# Altium footprint library 针式电感.PcbLib: 75 footprints (part 5 of 5)
Each footprint in its own frame and in the unit in brackets; x right, y up, seen from the top. Pads: shape width x height; smd on the part's side, far side on the other; paste and mask are expansions set on the pad; w line width, h text height; cw(c..) or ccw(c..) is an arc to the next point about the centre after c.
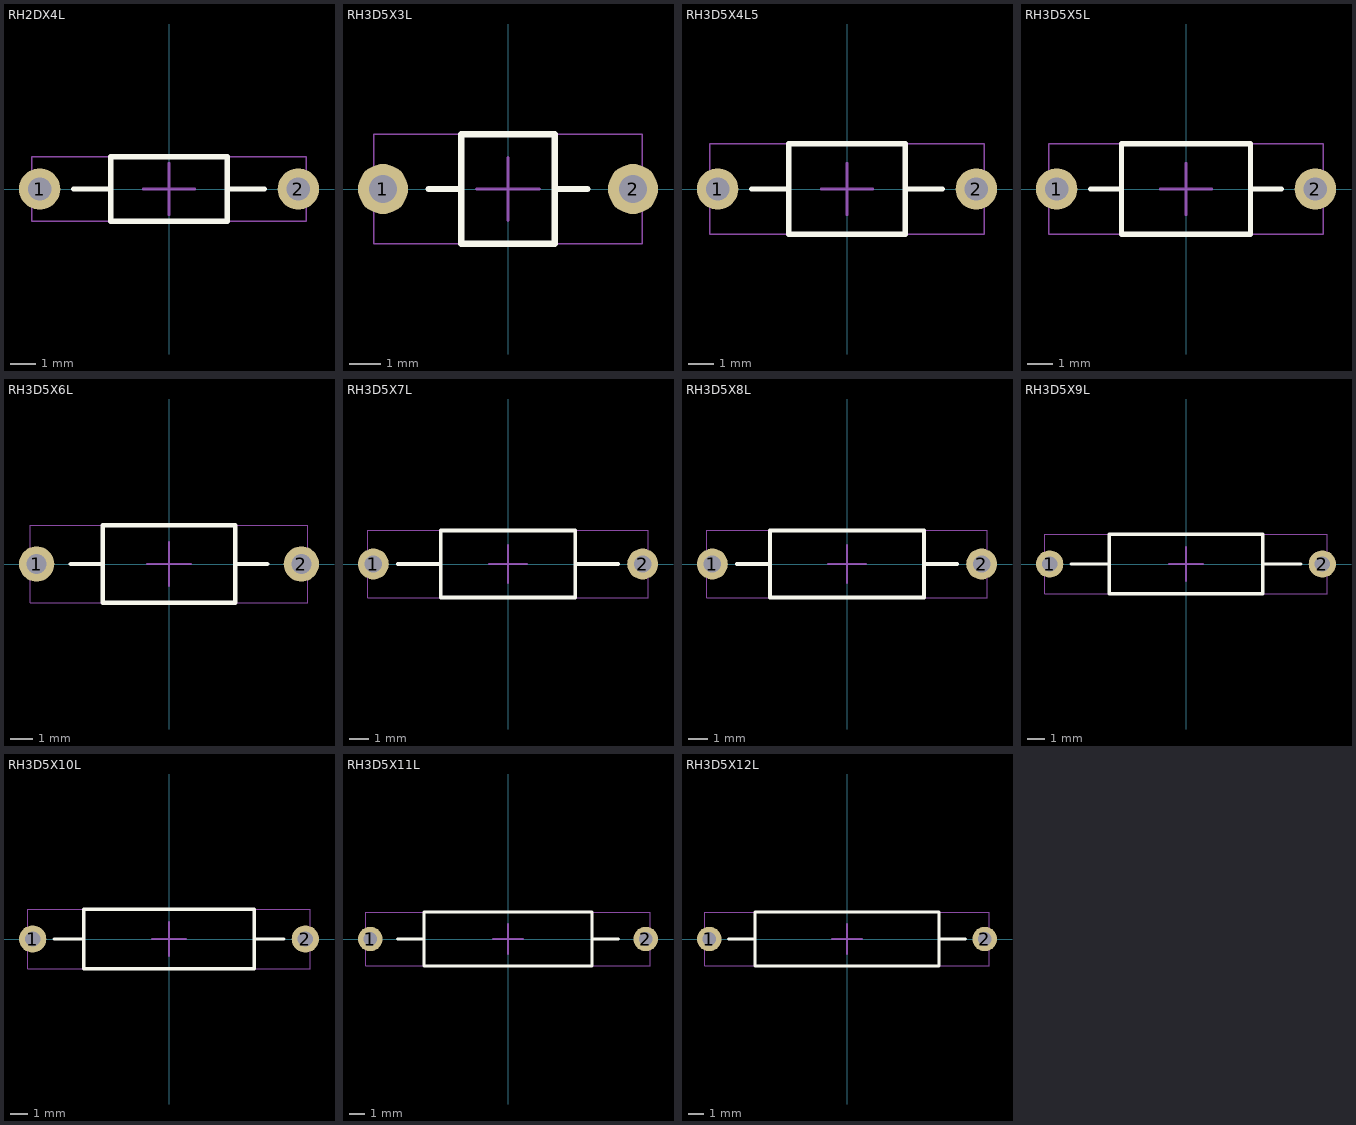
[diagram p4: the footprints below, top view; thin cyan lines are the x and y axes]

## RH2DX4L [mm] "穿心磁珠"
height 2
pads (2):
  round 1.6 hole 0.9: 1(-5,0) 2(5,0)
Top Overlay:
  lines w0.2: -3.683,0 -2.25,0 ; 2.25,0 3.683,0 ; -2.25,-1.25 -2.25,1.25 2.25,1.25 2.25,-1.25 -2.25,-1.25
Mechanical 13:
  lines w0.05: -5.3,-1.25 -5.3,1.25 5.3,1.25 5.3,-1.25 -5.3,-1.25
Mechanical 15:
  lines w0.1: -1,0 1,0 ; 0,-1 0,1
3D body: height 2.75, standoff -3.25, extent -5.3,-1.25 5.3,1.25

## RH3D5X3L [mm] "穿心磁珠"
height 3
pads (2):
  round 1.6 hole 0.9: 1(-4,0) 2(4,0)
Top Overlay:
  lines w0.2: -2.54,0 -1.5,0 ; 1.5,0 2.54,0 ; -1.5,-1.75 -1.5,1.75 1.5,1.75 1.5,-1.75 -1.5,-1.75
Mechanical 13:
  lines w0.05: -4.3,-1.75 -4.3,1.75 4.3,1.75 4.3,-1.75 -4.3,-1.75
Mechanical 15:
  lines w0.1: -1,0 1,0 ; 0,-1 0,1
3D body: height 3.55, standoff -3.71, extent -4.318,-1.778 4.282,1.722

## RH3D5X4L5 [mm] "穿心磁珠"
height 3.5
pads (2):
  round 1.6 hole 0.9: 1(-5,0) 2(5,0)
Top Overlay:
  lines w0.2: -3.683,0 -2.25,0 ; 2.25,0 3.683,0 ; -2.25,-1.75 2.25,-1.75 2.25,1.75 -2.25,1.75 -2.25,-1.75
Mechanical 13:
  lines w0.05: -5.3,-1.75 5.3,-1.75 5.3,1.75 -5.3,1.75 -5.3,-1.75
Mechanical 15:
  lines w0.1: -1,0 1,0 ; 0,-1 0,1
3D body: height 3.55, standoff -3.71, extent -5.3,-1.75 5.3,1.75

## RH3D5X5L [mm] "穿心磁珠"
height 3.5
pads (2):
  round 1.6 hole 0.9: 1(-5,0) 2(5,0)
Top Overlay:
  lines w0.2: -3.683,0 -2.5,0 ; 2.5,0 3.683,0 ; -2.5,-1.75 2.5,-1.75 2.5,1.75 -2.5,1.75 -2.5,-1.75
Mechanical 13:
  lines w0.05: -5.3,-1.75 5.3,-1.75 5.3,1.75 -5.3,1.75 -5.3,-1.75
Mechanical 15:
  lines w0.1: -1,0 1,0 ; 0,-1 0,1
3D body: height 3.55, standoff -3.71, extent -5.3,-1.75 5.3,1.75

## RH3D5X6L [mm] "穿心磁珠"
height 3.5
pads (2):
  round 1.6 hole 0.9: 1(-6,0) 2(6,0)
Top Overlay:
  lines w0.2: -4.445,0 -3,0 ; 3,0 4.445,0 ; -3,-1.75 -3,1.75 3,1.75 3,-1.75 -3,-1.75
Mechanical 13:
  lines w0.05: -6.3,-1.75 -6.3,1.75 6.3,1.75 6.3,-1.75 -6.3,-1.75
Mechanical 15:
  lines w0.1: -1,0 1,0 ; 0,-1 0,1
3D body: height 3.55, standoff -3.71, extent -6.3,-1.75 6.3,1.75

## RH3D5X7L [mm] "穿心磁珠"
height 3.5
pads (2):
  round 1.6 hole 0.9: 1(-7,0) 2(7,0)
Top Overlay:
  lines w0.2: -5.715,0 -3.5,0 ; 3.5,0 5.715,0 ; -3.5,-1.75 -3.5,1.75 3.5,1.75 3.5,-1.75 -3.5,-1.75
Mechanical 13:
  lines w0.05: -7.3,-1.75 -7.3,1.75 7.3,1.75 7.3,-1.75 -7.3,-1.75
Mechanical 15:
  lines w0.1: -1,0 1,0 ; 0,-1 0,1
3D body: height 3.55, standoff -3.71, extent -7.3,-1.75 7.3,1.75

## RH3D5X8L [mm] "穿心磁珠"
height 3.5
pads (2):
  round 1.6 hole 0.9: 1(-7,0) 2(7,0)
Top Overlay:
  lines w0.2: -5.715,0 -4,0 ; 4,0 5.715,0 ; -4,-1.75 4,-1.75 4,1.75 -4,1.75 -4,-1.75
Mechanical 13:
  lines w0.05: -7.3,-1.75 7.3,-1.75 7.3,1.75 -7.3,1.75 -7.3,-1.75
Mechanical 15:
  lines w0.1: -1,0 1,0 ; 0,-1 0,1
3D body: height 3.55, standoff -3.71, extent -7.3,-1.75 7.3,1.75

## RH3D5X9L [mm] "穿心磁珠"
height 3.5
pads (2):
  round 1.6 hole 0.9: 1(-8,0) 2(8,0)
Top Overlay:
  lines w0.2: -6.731,0 -4.5,0 ; 4.5,0 6.731,0 ; -4.5,-1.75 4.5,-1.75 4.5,1.75 -4.5,1.75 -4.5,-1.75
Mechanical 13:
  lines w0.05: -8.3,-1.75 8.3,-1.75 8.3,1.75 -8.3,1.75 -8.3,-1.75
Mechanical 15:
  lines w0.1: -1,0 1,0 ; 0,-1 0,1
3D body: height 3.55, standoff -3.71, extent -8.3,-1.75 8.3,1.75

## RH3D5X10L [mm] "穿心磁珠"
height 3.5
pads (2):
  round 1.6 hole 0.9: 1(-8,0) 2(8,0)
Top Overlay:
  lines w0.2: -6.731,0 -5,0 ; 5,0 6.731,0 ; -5,-1.75 -5,1.75 5,1.75 5,-1.75 -5,-1.75
Mechanical 13:
  lines w0.05: -8.3,-1.75 -8.3,1.75 8.3,1.75 8.3,-1.75 -8.3,-1.75
Mechanical 15:
  lines w0.1: -1,0 1,0 ; 0,-1 0,1
3D body: height 3.55, standoff -3.71, extent -8.3,-1.75 8.3,1.75

## RH3D5X11L [mm] "穿心磁珠"
height 3.5
pads (2):
  round 1.6 hole 0.9: 1(-9,0) 2(9,0)
Top Overlay:
  lines w0.2: -7.231,0 -5.5,0 ; 5.5,0 7.231,0 ; -5.5,-1.75 -5.5,1.75 5.5,1.75 5.5,-1.75 -5.5,-1.75
Mechanical 13:
  lines w0.05: -9.3,-1.75 -9.3,1.75 9.3,1.75 9.3,-1.75 -9.3,-1.75
Mechanical 15:
  lines w0.1: -1,0 1,0 ; 0,-1 0,1
3D body: height 3.55, standoff -3.71, extent -9.3,-1.75 9.3,1.75

## RH3D5X12L [mm] "穿心磁珠"
height 3.5
pads (2):
  round 1.6 hole 0.9: 1(-9,0) 2(9,0)
Top Overlay:
  lines w0.2: -7.731,0 -6,0 ; 6,0 7.731,0 ; -6,-1.75 6,-1.75 6,1.75 -6,1.75 -6,-1.75
Mechanical 13:
  lines w0.05: -9.3,-1.75 9.3,-1.75 9.3,1.75 -9.3,1.75 -9.3,-1.75
Mechanical 15:
  lines w0.1: -1,0 1,0 ; 0,-1 0,1
3D body: height 3.55, standoff -3.71, extent -9.3,-1.75 9.3,1.75